# Altium footprint library agh_racing_2018.PcbLib: 174 footprints (part 5 of 11)
Each footprint in its own frame and in the unit in brackets; x right, y up, seen from the top. Pads: shape width x height; smd on the part's side, far side on the other; paste and mask are expansions set on the pad; w line width, h text height; cw(c..) or ccw(c..) is an arc to the next point about the centre after c.
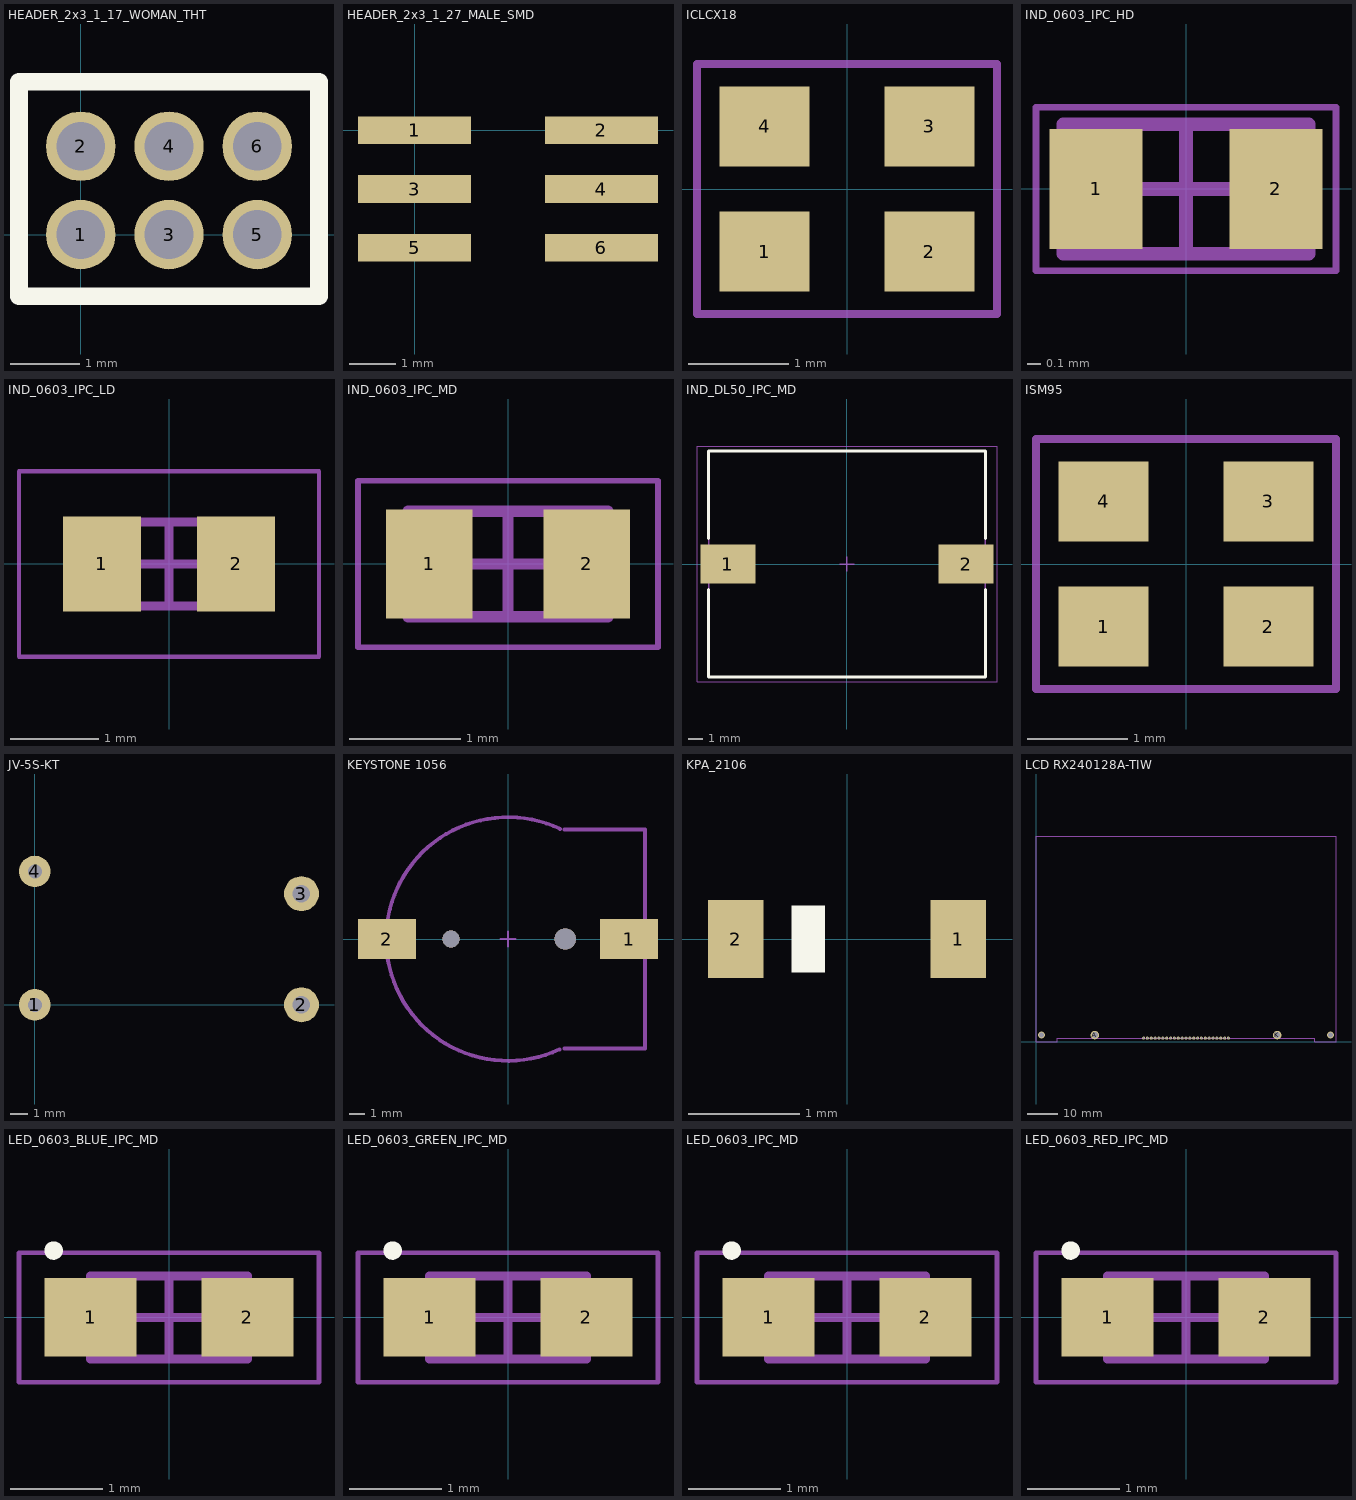
[diagram p4: the footprints below, top view; thin cyan lines are the x and y axes]

## HEADER_2x3_1_17_WOMAN_THT [mm]
height 4
pads (6):
  round 1 hole 0.7: 1(0,0) 2(0,1.27) 3(1.27,0) 4(1.27,1.27) 5(2.54,0) 6(2.54,1.27)
Top Overlay:
  lines w0.254: -0.889,-0.889 -0.889,2.2 3.429,2.2 3.429,-0.889 -0.889,-0.889
3D body: height 2.6, standoff 0, extent 0.635,-0.508 0.635,-0.508
3D body: height 2.6, standoff -0.9, extent -0.127,-0.127 0.127,0.127
3D body: height 2.6, standoff -0.9, extent 1.143,-0.127 1.397,0.127
3D body: height 2.6, standoff -0.9, extent 2.413,-0.127 2.667,0.127
3D body: height 4.1, standoff -0.9, extent 2.413,1.143 2.667,1.397
3D body: height 4.1, standoff -0.9, extent 1.143,1.143 1.397,1.397
3D body: height 4.1, standoff -0.9, extent -0.127,1.143 0.127,1.397
3D body: height 2.6, standoff 2.6, extent -0.127,0 -0.127,0
3D body: height 2.6, standoff 2.6, extent -0.127,0 -0.127,0
3D body: height 3, standoff 2.6, extent 1.002,-1.25 1.002,-1.25
3D body: height 3, standoff 2.6, extent 1.002,-1.123 1.002,-1.123
3D body: height 3, standoff 2.6, extent 0.748,-1.377 0.748,-1.377
3D body: height 2.8, standoff 2.6, extent -0.125,-0.353 0.126,0.127
3D body: height 2.8, standoff 2.6, extent 1.145,-0.353 1.396,0.127
3D body: height 2.8, standoff 2.6, extent 2.415,-0.353 2.666,0.127
3D body: height 3, standoff 2.6, extent -1.525,1.375 -1.525,1.375
3D body: height 3, standoff 2.6, extent 0.302,-1.123 0.302,-1.123
3D body: height 4.1, standoff 3.9, extent -0.112,-0.337 0.113,1.388
3D body: height 4.1, standoff 3.9, extent 1.163,-0.362 1.388,1.363
3D body: height 4.1, standoff 3.9, extent 2.413,-0.362 2.638,1.363
3D body: height 5.6, standoff 2.4, extent -0.625,-4.95 3.125,-0.35

## HEADER_2x3_1_27_MALE_SMD [mm]
pads (6):
  rect 2.45x0.6 smd: 1(0,0) 2(4.05,0) 3(0,-1.27) 4(4.05,-1.27) 5(0,-2.54) 6(4.05,-2.54)
3D body "pin_header_a-sl127-dg-g02mp1.stp": height 6.4, standoff 0, extent -0.727,-0.635 4.777,0.635
3D body "pin_header_a-sl127-dg-g02mp1.stp": height 6.4, standoff 0, extent -0.727,-1.905 4.777,-0.635
3D body "pin_header_a-sl127-dg-g02mp1.stp": height 6.4, standoff 0, extent -0.727,-3.175 4.777,-1.905

## ICLCX18 [mm]
pads (4):
  rect 0.9x0.8 smd: 1(-0.825,-0.625) 2(0.825,-0.625) 3(0.825,0.625) 4(-0.825,0.625)
Mechanical 15:
  lines w0.076: -1.5,-1.25 -1.5,1.25 1.5,1.25 1.5,-1.25 -1.5,-1.25
3D body: height 0.8, standoff 0, extent -1.25,-1 1.25,1

## IND_0603_IPC_HD [mm] "Chip Inductor, 2-Leads, Body 1.60x0.80mm, IPC High Density"
height 0.95
pads (2):
  rect 0.68x0.88 smd: 1(-0.66,0) 2(0.66,0)
Mechanical 13:
  lines w0.1: -0.9,-0.475 -0.9,0.475 0.9,0.475 0.9,-0.475 -0.9,-0.475
Mechanical 15:
  lines w0.05: -1.1,-0.6 -1.1,0.6 1.1,0.6 1.1,-0.6 -1.1,-0.6
  lines w0.1: -0.475,0 0.475,0 ; 0,-0.475 0,0.475
3D body "IND_0603_IPC_HD.step": height 0.95, standoff 0, extent -0.9,-0.475 0.9,0.475

## IND_0603_IPC_LD [mm] "Chip Inductor, 2-Leads, Body 1.60x0.80mm, IPC Low Density"
height 0.95
pads (2):
  rect 0.88x1.08 smd: 1(-0.76,0) 2(0.76,0)
Mechanical 13:
  lines w0.1: -0.9,-0.475 0.9,-0.475 0.9,0.475 -0.9,0.475 -0.9,-0.475
Mechanical 15:
  lines w0.05: -1.7,-1.05 1.7,-1.05 1.7,1.05 -1.7,1.05 -1.7,-1.05
  lines w0.1: -0.475,0 0.475,0 ; 0,-0.475 0,0.475
3D body "IND_0603_IPC_LD.step": height 0.95, standoff 0, extent -0.9,-0.475 0.9,0.475

## IND_0603_IPC_MD [mm] "Chip Inductor, 2-Leads, Body 1.60x0.80mm, IPC Medium Density"
height 0.95
pads (2):
  rect 0.78x0.98 smd: 1(-0.71,0) 2(0.71,0)
Mechanical 13:
  lines w0.1: -0.9,-0.475 0.9,-0.475 0.9,0.475 -0.9,0.475 -0.9,-0.475
Mechanical 15:
  lines w0.05: -1.35,-0.75 1.35,-0.75 1.35,0.75 -1.35,0.75 -1.35,-0.75
  lines w0.1: -0.475,0 0.475,0 ; 0,-0.475 0,0.475
3D body "IND_0603_IPC_MD.step": height 0.95, standoff 0, extent -0.9,-0.475 0.9,0.475

## IND_DL50_IPC_MD [mm] "DL50, Inductor, Ferrocore, IPC Medium Density"
height 7.11
pads (2):
  rect 3.7x2.65 smd: 1(-8,0) 2(8,0)
Top Overlay:
  lines w0.2: -9.3,-1.725 -9.3,-7.6 9.3,-7.6 9.3,-1.725 ; -9.3,1.725 -9.3,7.6 9.3,7.6 9.3,1.725
Mechanical 13:
  lines w0.1: -9.27,-7.62 9.27,-7.62 9.27,7.62 -9.27,7.62 -9.27,-7.62
Mechanical 15:
  lines w0.05: -10.075,-7.9 10.075,-7.9 10.075,7.9 -10.075,7.9 -10.075,-7.9
  lines w0.1: -0.5,0 0.5,0 ; 0,-0.5 0,0.5
3D body "IND_DL50_IPC_MD.step": height 7.21, standoff 0, extent -9.18,-7.62 9.18,7.62

## ISM95 [mm] "2.5x2.0x0.8mm SMD Oscillator"
height 0.8
pads (4):
  rect 0.9x0.8 smd: 1(-0.825,-0.625) 2(0.825,-0.625) 3(0.825,0.625) 4(-0.825,0.625)
Mechanical 15:
  lines w0.076: -1.5,-1.25 1.5,-1.25 1.5,1.25 -1.5,1.25 -1.5,-1.25
3D body: height 0.8, standoff 0, extent -1.25,-1 1.25,1

## JV-5S-KT [mm] "Relay mini, PCB"
height 12.5
pads (4):
  round 1.8 hole 0.8: 1(0,0) 4(0,7.62)
  round 2 hole 1: 2(15.24,0) 3(15.24,6.35)
3D body "relay_mini.SLDPRT": height 12.51, standoff -3.79, extent -1.33,-1.19 16.17,8.81

## KEYSTONE 1056 [mm] "KEYSTONE KEYS1056  for  BR1220, CR1220 batteries, 4mm height, SMD"
height 4
pads (2):
  rect 3.8x2.6 smd: 1(7.95,0) 2(-7.95,0)
via 3.75,0 diameter 1.4 hole 1.4
via -3.75,0 diameter 1.1 hole 1.1
Mechanical 15:
  lines w0.1: -0.5,0 0.5,0 ; 0,-0.5 0,0.5
  lines w0.254: 3.378,-7.252 cw(c0,0) 3.416,7.234 ; 3.7,-7.2 9,-7.2 9,7.2 3.7,7.2
3D body "User Library-Battery Holder for CR1220 SMD.STEP": height 4.23, standoff -0.52, extent -9.125,-7.4 9.675,7.349

## KPA_2106 [mm]
pads (2):
  rect 0.5x0.7 smd: 1(1,0) 2(-1,0)
Top Overlay:
  rectangle: -0.5,-0.3 -0.2,0.3
3D body: height 0.6, standoff 0, extent -1,-0.25 1,0.75

## LCD RX240128A-TIW [mm] "LCD Footprint"
pads (25):
  round 1.016 hole 0.6: 1(35.38,1.23) 2(36.65,1.23) 3(37.92,1.23) 4(39.19,1.23) 5(40.46,1.23) 6(41.73,1.23) 7(43,1.23) 8(44.27,1.23) 9(45.54,1.23) 10(46.81,1.23) 11(48.08,1.23) 12(49.35,1.23) 13(50.62,1.23) 14(51.89,1.23) 15(53.16,1.23) 16(54.43,1.23) 17(55.7,1.23) 18(56.97,1.23) 19(58.24,1.23) 20(59.51,1.23) 21(60.78,1.23) 22(62.05,1.23) 23(63.32,1.23)
  round 2.8 hole 2: A(19.35,2.25) K(79.35,2.25)
via 96.87,2.25 diameter 2.2 hole 1.7
via 1.83,2.25 diameter 2.2 hole 1.7
Mechanical 13:
  lines w0.254: 0,0 7,0 7,1.2 91.7,1.2 91.7,0 98.7,0 98.7,67.7 0,67.7 0,0
3D body "LCD.STEP": height 5.7, standoff -4.9, extent 0.001,0 98.701,67.7

## LED_0603_BLUE_IPC_MD [mm] "Molded Diode, 2-Leads, Body 1,60x0,80mm, IPC Medium Density"
height 0.5
pads (2):
  rect 1x0.85 smd: 1(-0.85,0) 2(0.85,0)
Top Overlay:
  circle w0.1: c-1.25,0.725 r0.05
Mechanical 13:
  rectangle: -0.85,-0.45 -0.621,0.45
  lines w0.1: -0.85,-0.45 0.85,-0.45 0.85,0.45 -0.85,0.45 -0.85,-0.45
Mechanical 15:
  lines w0.05: -1.625,-0.7 1.625,-0.7 1.625,0.7 -1.625,0.7 -1.625,-0.7
  lines w0.1: -0.45,0 0.45,0 ; 0,-0.45 0,0.45
3D body "LED 0603 blue.STEP": height 0.7, standoff -0.01, extent -0.8,-0.4 0.8,0.387

## LED_0603_GREEN_IPC_MD [mm] "Molded Diode, 2-Leads, Body 1,60x0,80mm, IPC Medium Density"
height 0.5
pads (2):
  rect 1x0.85 smd: 1(-0.85,0) 2(0.85,0)
Top Overlay:
  circle w0.1: c-1.25,0.725 r0.05
Mechanical 13:
  rectangle: -0.85,-0.45 -0.621,0.45
  lines w0.1: -0.85,-0.45 0.85,-0.45 0.85,0.45 -0.85,0.45 -0.85,-0.45
Mechanical 15:
  lines w0.05: -1.625,-0.7 1.625,-0.7 1.625,0.7 -1.625,0.7 -1.625,-0.7
  lines w0.1: -0.45,0 0.45,0 ; 0,-0.45 0,0.45
3D body "LED 0603 green.STEP": height 0.7, standoff -0.01, extent -0.8,-0.394 0.8,0.394

## LED_0603_IPC_MD [mm] "Molded Diode, 2-Leads, Body 1,60x0,80mm, IPC Medium Density"
height 0.5
pads (2):
  rect 1x0.85 smd: 1(-0.85,0) 2(0.85,0)
Top Overlay:
  circle w0.1: c-1.25,0.725 r0.05
Mechanical 13:
  rectangle: -0.85,-0.45 -0.621,0.45
  lines w0.1: -0.85,-0.45 -0.85,0.45 0.85,0.45 0.85,-0.45 -0.85,-0.45
Mechanical 15:
  lines w0.05: -1.625,-0.7 -1.625,0.7 1.625,0.7 1.625,-0.7 -1.625,-0.7
  lines w0.1: -0.45,0 0.45,0 ; 0,-0.45 0,0.45
3D body "LED_0805_IPC_MD.step": height 0.5, standoff 0, extent -1.07,-0.45 1.07,0.45

## LED_0603_RED_IPC_MD [mm] "Molded Diode, 2-Leads, Body 1,60x0,80mm, IPC Medium Density"
height 0.5
pads (2):
  rect 1x0.85 smd: 1(-0.85,0) 2(0.85,0)
Top Overlay:
  circle w0.1: c-1.25,0.725 r0.05
Mechanical 13:
  rectangle: -0.85,-0.45 -0.621,0.45
  lines w0.1: -0.85,-0.45 0.85,-0.45 0.85,0.45 -0.85,0.45 -0.85,-0.45
Mechanical 15:
  lines w0.05: -1.625,-0.7 1.625,-0.7 1.625,0.7 -1.625,0.7 -1.625,-0.7
  lines w0.1: -0.45,0 0.45,0 ; 0,-0.45 0,0.45
3D body "LED 0603 red.STEP": height 0.7, standoff -0.01, extent -0.8,-0.394 0.8,0.394